# Altium footprint library ST封装.PcbLib: 1336 footprints (part 89 of 109) (continued)
## SQFP40X40-304(T) [mm] (continued)
Top Overlay:
  lines w0.2: -20.85,-40.15 -20.85,-41.8 -19.2,-41.8 ; -20.85,-1.25 -20.85,-0.4 -20.05,0.4 -19.2,0.4 ; 19.7,-41.8 21.35,-41.8 21.35,-40.15 ; 19.7,0.4 21.35,0.4 21.35,-1.25

## SQFP40X40-312(N) [mm]
pads (312):
  rect 1.6x0.4 smd: 1(0,0)
  oval 1.6x0.4 smd: 2(0,-0.5) 3(0,-1) 4(0,-1.5) 5(0,-2) 6(0,-2.5) 7(0,-3) 8(0,-3.5) 9(0,-4) 10(0,-4.5) 11(0,-5) 12(0,-5.5) 13(0,-6) 14(0,-6.5) 15(0,-7) 16(0,-7.5) 17(0,-8) 18(0,-8.5) 19(0,-9) 20(0,-9.5) 21(0,-10) 22(0,-10.5) 23(0,-11) 24(0,-11.5) 25(0,-12) 26(0,-12.5) 27(0,-13) 28(0,-13.5) 29(0,-14) 30(0,-14.5) 31(0,-15) 32(0,-15.5) 33(0,-16) 34(0,-16.5) 35(0,-17) 36(0,-17.5) 37(0,-18) 38(0,-18.5) 39(0,-19) 40(0,-19.5) 41(0,-20) 42(0,-20.5) 43(0,-21) 44(0,-21.5) 45(0,-22) 46(0,-22.5) 47(0,-23) 48(0,-23.5) 49(0,-24) 50(0,-24.5) 51(0,-25) 52(0,-25.5) 53(0,-26) 54(0,-26.5) 55(0,-27) 56(0,-27.5) 57(0,-28) 58(0,-28.5) 59(0,-29) 60(0,-29.5) 61(0,-30) 62(0,-30.5) 63(0,-31) 64(0,-31.5) 65(0,-32) 66(0,-32.5) 67(0,-33) 68(0,-33.5) 69(0,-34) 70(0,-34.5) 71(0,-35) 72(0,-35.5) 73(0,-36) 74(0,-36.5) 75(0,-37) 76(0,-37.5) 77(0,-38) 78(0,-38.5) 157(41.4,-38.5) 158(41.4,-38) 159(41.4,-37.5) 160(41.4,-37) 161(41.4,-36.5) 162(41.4,-36) 163(41.4,-35.5) 164(41.4,-35) 165(41.4,-34.5) 166(41.4,-34) 167(41.4,-33.5) 168(41.4,-33) 169(41.4,-32.5) 170(41.4,-32) 171(41.4,-31.5) 172(41.4,-31) 173(41.4,-30.5) 174(41.4,-30) 175(41.4,-29.5) 176(41.4,-29) 177(41.4,-28.5) 178(41.4,-28) 179(41.4,-27.5) 180(41.4,-27) 181(41.4,-26.5) 182(41.4,-26) 183(41.4,-25.5) 184(41.4,-25) 185(41.4,-24.5) 186(41.4,-24) 187(41.4,-23.5) 188(41.4,-23) 189(41.4,-22.5) 190(41.4,-22) 191(41.4,-21.5) 192(41.4,-21) 193(41.4,-20.5) 194(41.4,-20) 195(41.4,-19.5) 196(41.4,-19) 197(41.4,-18.5) 198(41.4,-18) 199(41.4,-17.5) 200(41.4,-17) 201(41.4,-16.5) 202(41.4,-16) 203(41.4,-15.5) 204(41.4,-15) 205(41.4,-14.5) 206(41.4,-14) 207(41.4,-13.5) 208(41.4,-13) 209(41.4,-12.5) 210(41.4,-12) 211(41.4,-11.5) 212(41.4,-11) 213(41.4,-10.5) 214(41.4,-10) 215(41.4,-9.5) 216(41.4,-9) 217(41.4,-8.5) 218(41.4,-8) 219(41.4,-7.5) 220(41.4,-7) 221(41.4,-6.5) 222(41.4,-6) 223(41.4,-5.5) 224(41.4,-5) 225(41.4,-4.5) 226(41.4,-4) 227(41.4,-3.5) 228(41.4,-3) 229(41.4,-2.5) 230(41.4,-2) 231(41.4,-1.5) 232(41.4,-1) 233(41.4,-0.5) 234(41.4,0)
  oval 0.4x1.6 smd: 79(1.45,-39.95) 80(1.95,-39.95) 81(2.45,-39.95) 82(2.95,-39.95) 83(3.45,-39.95) 84(3.95,-39.95) 85(4.45,-39.95) 86(4.95,-39.95) 87(5.45,-39.95) 88(5.95,-39.95) 89(6.45,-39.95) 90(6.95,-39.95) 91(7.45,-39.95) 92(7.95,-39.95) 93(8.45,-39.95) 94(8.95,-39.95) 95(9.45,-39.95) 96(9.95,-39.95) 97(10.45,-39.95) 98(10.95,-39.95) 99(11.45,-39.95) 100(11.95,-39.95) 101(12.45,-39.95) 102(12.95,-39.95) 103(13.45,-39.95) 104(13.95,-39.95) 105(14.45,-39.95) 106(14.95,-39.95) 107(15.45,-39.95) 108(15.95,-39.95) 109(16.45,-39.95) 110(16.95,-39.95) 111(17.45,-39.95) 112(17.95,-39.95) 113(18.45,-39.95) 114(18.95,-39.95) 115(19.45,-39.95) 116(19.95,-39.95) 117(20.45,-39.95) 118(20.95,-39.95) 119(21.45,-39.95) 120(21.95,-39.95) 121(22.45,-39.95) 122(22.95,-39.95) 123(23.45,-39.95) 124(23.95,-39.95) 125(24.45,-39.95) 126(24.95,-39.95) 127(25.45,-39.95) 128(25.95,-39.95) 129(26.45,-39.95) 130(26.95,-39.95) 131(27.45,-39.95) 132(27.95,-39.95) 133(28.45,-39.95) 134(28.95,-39.95) 135(29.45,-39.95) 136(29.95,-39.95) 137(30.45,-39.95) 138(30.95,-39.95) 139(31.45,-39.95) 140(31.95,-39.95) 141(32.45,-39.95) 142(32.95,-39.95) 143(33.45,-39.95) 144(33.95,-39.95) 145(34.45,-39.95) 146(34.95,-39.95) 147(35.45,-39.95) 148(35.95,-39.95) 149(36.45,-39.95) 150(36.95,-39.95) 151(37.45,-39.95) 152(37.95,-39.95) 153(38.45,-39.95) 154(38.95,-39.95) 155(39.45,-39.95) 156(39.95,-39.95) 235(39.95,1.45) 236(39.45,1.45) 237(38.95,1.45) 238(38.45,1.45) 239(37.95,1.45) 240(37.45,1.45) 241(36.95,1.45) 242(36.45,1.45) 243(35.95,1.45) 244(35.45,1.45) 245(34.95,1.45) 246(34.45,1.45) 247(33.95,1.45) 248(33.45,1.45) 249(32.95,1.45) 250(32.45,1.45) 251(31.95,1.45) 252(31.45,1.45) 253(30.95,1.45) 254(30.45,1.45) 255(29.95,1.45) 256(29.45,1.45) 257(28.95,1.45) 258(28.45,1.45) 259(27.95,1.45) 260(27.45,1.45) 261(26.95,1.45) 262(26.45,1.45) 263(25.95,1.45) 264(25.45,1.45) 265(24.95,1.45) 266(24.45,1.45) 267(23.95,1.45) 268(23.45,1.45) 269(22.95,1.45) 270(22.45,1.45) 271(21.95,1.45) 272(21.45,1.45) 273(20.95,1.45) 274(20.45,1.45) 275(19.95,1.45) 276(19.45,1.45) 277(18.95,1.45) 278(18.45,1.45) 279(17.95,1.45) 280(17.45,1.45) 281(16.95,1.45) 282(16.45,1.45) 283(15.95,1.45) 284(15.45,1.45) 285(14.95,1.45) 286(14.45,1.45) 287(13.95,1.45) 288(13.45,1.45) 289(12.95,1.45) 290(12.45,1.45) 291(11.95,1.45) 292(11.45,1.45) 293(10.95,1.45) 294(10.45,1.45) 295(9.95,1.45) 296(9.45,1.45) 297(8.95,1.45) 298(8.45,1.45) 299(7.95,1.45) 300(7.45,1.45) 301(6.95,1.45) 302(6.45,1.45) 303(5.95,1.45) 304(5.45,1.45) 305(4.95,1.45) 306(4.45,1.45) 307(3.95,1.45) 308(3.45,1.45) 309(2.95,1.45) 310(2.45,1.45) 311(1.95,1.45) 312(1.45,1.45)
Top Overlay:
  lines w0.2: -0.4,-39.2 -0.4,-40.35 0.75,-40.35 ; -0.4,0.7 -0.4,1.05 0.4,1.85 0.75,1.85 ; 40.65,-40.35 41.8,-40.35 41.8,-39.2 ; 40.65,1.85 41.8,1.85 41.8,0.7

## SQFP40X40-312(T) [mm]
pads (312):
  rect 0.4x1.6 smd: 1(0,0)
  oval 0.4x1.6 smd: 2(-0.5,0) 3(-1,0) 4(-1.5,0) 5(-2,0) 6(-2.5,0) 7(-3,0) 8(-3.5,0) 9(-4,0) 10(-4.5,0) 11(-5,0) 12(-5.5,0) 13(-6,0) 14(-6.5,0) 15(-7,0) 16(-7.5,0) 17(-8,0) 18(-8.5,0) 19(-9,0) 20(-9.5,0) 21(-10,0) 22(-10.5,0) 23(-11,0) 24(-11.5,0) 25(-12,0) 26(-12.5,0) 27(-13,0) 28(-13.5,0) 29(-14,0) 30(-14.5,0) 31(-15,0) 32(-15.5,0) 33(-16,0) 34(-16.5,0) 35(-17,0) 36(-17.5,0) 37(-18,0) 38(-18.5,0) 39(-19,0) 118(-19,-41.4) 119(-18.5,-41.4) 120(-18,-41.4) 121(-17.5,-41.4) 122(-17,-41.4) 123(-16.5,-41.4) 124(-16,-41.4) 125(-15.5,-41.4) 126(-15,-41.4) 127(-14.5,-41.4) 128(-14,-41.4) 129(-13.5,-41.4) 130(-13,-41.4) 131(-12.5,-41.4) 132(-12,-41.4) 133(-11.5,-41.4) 134(-11,-41.4) 135(-10.5,-41.4) 136(-10,-41.4) 137(-9.5,-41.4) 138(-9,-41.4) 139(-8.5,-41.4) 140(-8,-41.4) 141(-7.5,-41.4) 142(-7,-41.4) 143(-6.5,-41.4) 144(-6,-41.4) 145(-5.5,-41.4) 146(-5,-41.4) 147(-4.5,-41.4) 148(-4,-41.4) 149(-3.5,-41.4) 150(-3,-41.4) 151(-2.5,-41.4) 152(-2,-41.4) 153(-1.5,-41.4) 154(-1,-41.4) 155(-0.5,-41.4) 156(0,-41.4) 157(0.5,-41.4) 158(1,-41.4) 159(1.5,-41.4) 160(2,-41.4) 161(2.5,-41.4) 162(3,-41.4) 163(3.5,-41.4) 164(4,-41.4) 165(4.5,-41.4) 166(5,-41.4) 167(5.5,-41.4) 168(6,-41.4) 169(6.5,-41.4) 170(7,-41.4) 171(7.5,-41.4) 172(8,-41.4) 173(8.5,-41.4) 174(9,-41.4) 175(9.5,-41.4) 176(10,-41.4) 177(10.5,-41.4) 178(11,-41.4) 179(11.5,-41.4) 180(12,-41.4) 181(12.5,-41.4) 182(13,-41.4) 183(13.5,-41.4) 184(14,-41.4) 185(14.5,-41.4) 186(15,-41.4) 187(15.5,-41.4) 188(16,-41.4) 189(16.5,-41.4) 190(17,-41.4) 191(17.5,-41.4) 192(18,-41.4) 193(18.5,-41.4) 194(19,-41.4) 195(19.5,-41.4) 274(19.5,0) 275(19,0) 276(18.5,0) 277(18,0) 278(17.5,0) 279(17,0) 280(16.5,0) 281(16,0) 282(15.5,0) 283(15,0) 284(14.5,0) 285(14,0) 286(13.5,0) 287(13,0) 288(12.5,0) 289(12,0) 290(11.5,0) 291(11,0) 292(10.5,0) 293(10,0) 294(9.5,0) 295(9,0) 296(8.5,0) 297(8,0) 298(7.5,0) 299(7,0) 300(6.5,0) 301(6,0) 302(5.5,0) 303(5,0) 304(4.5,0) 305(4,0) 306(3.5,0) 307(3,0) 308(2.5,0) 309(2,0) 310(1.5,0) 311(1,0) 312(0.5,0)
  oval 1.6x0.4 smd: 40(-20.45,-1.45) 41(-20.45,-1.95) 42(-20.45,-2.45) 43(-20.45,-2.95) 44(-20.45,-3.45) 45(-20.45,-3.95) 46(-20.45,-4.45) 47(-20.45,-4.95) 48(-20.45,-5.45) 49(-20.45,-5.95) 50(-20.45,-6.45) 51(-20.45,-6.95) 52(-20.45,-7.45) 53(-20.45,-7.95) 54(-20.45,-8.45) 55(-20.45,-8.95) 56(-20.45,-9.45) 57(-20.45,-9.95) 58(-20.45,-10.45) 59(-20.45,-10.95) 60(-20.45,-11.45) 61(-20.45,-11.95) 62(-20.45,-12.45) 63(-20.45,-12.95) 64(-20.45,-13.45) 65(-20.45,-13.95) 66(-20.45,-14.45) 67(-20.45,-14.95) 68(-20.45,-15.45) 69(-20.45,-15.95) 70(-20.45,-16.45) 71(-20.45,-16.95) 72(-20.45,-17.45) 73(-20.45,-17.95) 74(-20.45,-18.45) 75(-20.45,-18.95) 76(-20.45,-19.45) 77(-20.45,-19.95) 78(-20.45,-20.45) 79(-20.45,-20.95) 80(-20.45,-21.45) 81(-20.45,-21.95) 82(-20.45,-22.45) 83(-20.45,-22.95) 84(-20.45,-23.45) 85(-20.45,-23.95) 86(-20.45,-24.45) 87(-20.45,-24.95) 88(-20.45,-25.45) 89(-20.45,-25.95) 90(-20.45,-26.45) 91(-20.45,-26.95) 92(-20.45,-27.45) 93(-20.45,-27.95) 94(-20.45,-28.45) 95(-20.45,-28.95) 96(-20.45,-29.45) 97(-20.45,-29.95) 98(-20.45,-30.45) 99(-20.45,-30.95) 100(-20.45,-31.45) 101(-20.45,-31.95) 102(-20.45,-32.45) 103(-20.45,-32.95) 104(-20.45,-33.45) 105(-20.45,-33.95) 106(-20.45,-34.45) 107(-20.45,-34.95) 108(-20.45,-35.45) 109(-20.45,-35.95) 110(-20.45,-36.45) 111(-20.45,-36.95) 112(-20.45,-37.45) 113(-20.45,-37.95) 114(-20.45,-38.45) 115(-20.45,-38.95) 116(-20.45,-39.45) 117(-20.45,-39.95) 196(20.95,-39.95) 197(20.95,-39.45) 198(20.95,-38.95) 199(20.95,-38.45) 200(20.95,-37.95) 201(20.95,-37.45) 202(20.95,-36.95) 203(20.95,-36.45) 204(20.95,-35.95) 205(20.95,-35.45) 206(20.95,-34.95) 207(20.95,-34.45) 208(20.95,-33.95) 209(20.95,-33.45) 210(20.95,-32.95) 211(20.95,-32.45) 212(20.95,-31.95) 213(20.95,-31.45) 214(20.95,-30.95) 215(20.95,-30.45) 216(20.95,-29.95) 217(20.95,-29.45) 218(20.95,-28.95) 219(20.95,-28.45) 220(20.95,-27.95) 221(20.95,-27.45) 222(20.95,-26.95) 223(20.95,-26.45) 224(20.95,-25.95) 225(20.95,-25.45) 226(20.95,-24.95) 227(20.95,-24.45) 228(20.95,-23.95) 229(20.95,-23.45) 230(20.95,-22.95) 231(20.95,-22.45) 232(20.95,-21.95) 233(20.95,-21.45) 234(20.95,-20.95) 235(20.95,-20.45) 236(20.95,-19.95) 237(20.95,-19.45) 238(20.95,-18.95) 239(20.95,-18.45) 240(20.95,-17.95) 241(20.95,-17.45) 242(20.95,-16.95) 243(20.95,-16.45) 244(20.95,-15.95) 245(20.95,-15.45) 246(20.95,-14.95) 247(20.95,-14.45) 248(20.95,-13.95) 249(20.95,-13.45) 250(20.95,-12.95) 251(20.95,-12.45) 252(20.95,-11.95) 253(20.95,-11.45) 254(20.95,-10.95) 255(20.95,-10.45) 256(20.95,-9.95) 257(20.95,-9.45) 258(20.95,-8.95) 259(20.95,-8.45) 260(20.95,-7.95) 261(20.95,-7.45) 262(20.95,-6.95) 263(20.95,-6.45) 264(20.95,-5.95) 265(20.95,-5.45) 266(20.95,-4.95) 267(20.95,-4.45) 268(20.95,-3.95) 269(20.95,-3.45) 270(20.95,-2.95) 271(20.95,-2.45) 272(20.95,-1.95) 273(20.95,-1.45)
Top Overlay:
  lines w0.2: -20.85,-40.65 -20.85,-41.8 -19.7,-41.8 ; -20.85,-0.75 -20.85,-0.4 -20.05,0.4 -19.7,0.4 ; 20.2,-41.8 21.35,-41.8 21.35,-40.65 ; 20.2,0.4 21.35,0.4 21.35,-0.75

## SQFP40X40-384(N) [mm]
pads (384):
  rect 1.6x0.3 smd: 1(0,0)
  oval 1.6x0.3 smd: 2(0,-0.4) 3(0,-0.8) 4(0,-1.2) 5(0,-1.6) 6(0,-2) 7(0,-2.4) 8(0,-2.8) 9(0,-3.2) 10(0,-3.6) 11(0,-4) 12(0,-4.4) 13(0,-4.8) 14(0,-5.2) 15(0,-5.6) 16(0,-6) 17(0,-6.4) 18(0,-6.8) 19(0,-7.2) 20(0,-7.6) 21(0,-8) 22(0,-8.4) 23(0,-8.8) 24(0,-9.2) 25(0,-9.6) 26(0,-10) 27(0,-10.4) 28(0,-10.8) 29(0,-11.2) 30(0,-11.6) 31(0,-12) 32(0,-12.4) 33(0,-12.8) 34(0,-13.2) 35(0,-13.6) 36(0,-14) 37(0,-14.4) 38(0,-14.8) 39(0,-15.2) 40(0,-15.6) 41(0,-16) 42(0,-16.4) 43(0,-16.8) 44(0,-17.2) 45(0,-17.6) 46(0,-18) 47(0,-18.4) 48(0,-18.8) 49(0,-19.2) 50(0,-19.6) 51(0,-20) 52(0,-20.4) 53(0,-20.8) 54(0,-21.2) 55(0,-21.6) 56(0,-22) 57(0,-22.4) 58(0,-22.8) 59(0,-23.2) 60(0,-23.6) 61(0,-24) 62(0,-24.4) 63(0,-24.8) 64(0,-25.2) 65(0,-25.6) 66(0,-26) 67(0,-26.4) 68(0,-26.8) 69(0,-27.2) 70(0,-27.6) 71(0,-28) 72(0,-28.4) 73(0,-28.8) 74(0,-29.2) 75(0,-29.6) 76(0,-30) 77(0,-30.4) 78(0,-30.8) 79(0,-31.2) 80(0,-31.6) 81(0,-32) 82(0,-32.4) 83(0,-32.8) 84(0,-33.2) 85(0,-33.6) 86(0,-34) 87(0,-34.4) 88(0,-34.8) 89(0,-35.2) 90(0,-35.6) 91(0,-36) 92(0,-36.4) 93(0,-36.8) 94(0,-37.2) 95(0,-37.6) 96(0,-38) 193(41.4,-38) 194(41.4,-37.6) 195(41.4,-37.2) 196(41.4,-36.8) 197(41.4,-36.4) 198(41.4,-36) 199(41.4,-35.6) 200(41.4,-35.2) 201(41.4,-34.8) 202(41.4,-34.4) 203(41.4,-34) 204(41.4,-33.6) 205(41.4,-33.2) 206(41.4,-32.8) 207(41.4,-32.4) 208(41.4,-32) 209(41.4,-31.6) 210(41.4,-31.2) 211(41.4,-30.8) 212(41.4,-30.4) 213(41.4,-30) 214(41.4,-29.6) 215(41.4,-29.2) 216(41.4,-28.8) 217(41.4,-28.4) 218(41.4,-28) 219(41.4,-27.6) 220(41.4,-27.2) 221(41.4,-26.8) 222(41.4,-26.4) 223(41.4,-26) 224(41.4,-25.6) 225(41.4,-25.2) 226(41.4,-24.8) 227(41.4,-24.4) 228(41.4,-24) 229(41.4,-23.6) 230(41.4,-23.2) 231(41.4,-22.8) 232(41.4,-22.4) 233(41.4,-22) 234(41.4,-21.6) 235(41.4,-21.2) 236(41.4,-20.8) 237(41.4,-20.4) 238(41.4,-20) 239(41.4,-19.6) 240(41.4,-19.2) 241(41.4,-18.8) 242(41.4,-18.4) 243(41.4,-18) 244(41.4,-17.6) 245(41.4,-17.2) 246(41.4,-16.8) 247(41.4,-16.4) 248(41.4,-16) 249(41.4,-15.6) 250(41.4,-15.2) 251(41.4,-14.8) 252(41.4,-14.4) 253(41.4,-14) 254(41.4,-13.6) 255(41.4,-13.2) 256(41.4,-12.8) 257(41.4,-12.4) 258(41.4,-12) 259(41.4,-11.6) 260(41.4,-11.2) 261(41.4,-10.8) 262(41.4,-10.4) 263(41.4,-10) 264(41.4,-9.6) 265(41.4,-9.2) 266(41.4,-8.8) 267(41.4,-8.4) 268(41.4,-8) 269(41.4,-7.6) 270(41.4,-7.2) 271(41.4,-6.8) 272(41.4,-6.4) 273(41.4,-6) 274(41.4,-5.6) 275(41.4,-5.2) 276(41.4,-4.8) 277(41.4,-4.4) 278(41.4,-4) 279(41.4,-3.6) 280(41.4,-3.2) 281(41.4,-2.8) 282(41.4,-2.4) 283(41.4,-2) 284(41.4,-1.6) 285(41.4,-1.2) 286(41.4,-0.8) 287(41.4,-0.4) 288(41.4,0)
  oval 0.3x1.6 smd: 97(1.7,-39.7) 98(2.1,-39.7) 99(2.5,-39.7) 100(2.9,-39.7) 101(3.3,-39.7) 102(3.7,-39.7) 103(4.1,-39.7) 104(4.5,-39.7) 105(4.9,-39.7) 106(5.3,-39.7) 107(5.7,-39.7) 108(6.1,-39.7) 109(6.5,-39.7) 110(6.9,-39.7) 111(7.3,-39.7) 112(7.7,-39.7) 113(8.1,-39.7) 114(8.5,-39.7) 115(8.9,-39.7) 116(9.3,-39.7) 117(9.7,-39.7) 118(10.1,-39.7) 119(10.5,-39.7) 120(10.9,-39.7) 121(11.3,-39.7) 122(11.7,-39.7) 123(12.1,-39.7) 124(12.5,-39.7) 125(12.9,-39.7) 126(13.3,-39.7) 127(13.7,-39.7) 128(14.1,-39.7) 129(14.5,-39.7) 130(14.9,-39.7) 131(15.3,-39.7) 132(15.7,-39.7) 133(16.1,-39.7) 134(16.5,-39.7) 135(16.9,-39.7) 136(17.3,-39.7) 137(17.7,-39.7) 138(18.1,-39.7) 139(18.5,-39.7) 140(18.9,-39.7) 141(19.3,-39.7) 142(19.7,-39.7) 143(20.1,-39.7) 144(20.5,-39.7) 145(20.9,-39.7) 146(21.3,-39.7) 147(21.7,-39.7) 148(22.1,-39.7) 149(22.5,-39.7) 150(22.9,-39.7) 151(23.3,-39.7) 152(23.7,-39.7) 153(24.1,-39.7) 154(24.5,-39.7) 155(24.9,-39.7) 156(25.3,-39.7) 157(25.7,-39.7) 158(26.1,-39.7) 159(26.5,-39.7) 160(26.9,-39.7) 161(27.3,-39.7) 162(27.7,-39.7) 163(28.1,-39.7) 164(28.5,-39.7) 165(28.9,-39.7) 166(29.3,-39.7) 167(29.7,-39.7) 168(30.1,-39.7) 169(30.5,-39.7) 170(30.9,-39.7) 171(31.3,-39.7) 172(31.7,-39.7) 173(32.1,-39.7) 174(32.5,-39.7) 175(32.9,-39.7) 176(33.3,-39.7) 177(33.7,-39.7) 178(34.1,-39.7) 179(34.5,-39.7) 180(34.9,-39.7) 181(35.3,-39.7) 182(35.7,-39.7) 183(36.1,-39.7) 184(36.5,-39.7) 185(36.9,-39.7) 186(37.3,-39.7) 187(37.7,-39.7) 188(38.1,-39.7) 189(38.5,-39.7) 190(38.9,-39.7) 191(39.3,-39.7) 192(39.7,-39.7) 289(39.7,1.7) 290(39.3,1.7) 291(38.9,1.7) 292(38.5,1.7) 293(38.1,1.7) 294(37.7,1.7) 295(37.3,1.7) 296(36.9,1.7) 297(36.5,1.7) 298(36.1,1.7) 299(35.7,1.7) 300(35.3,1.7) 301(34.9,1.7) 302(34.5,1.7) 303(34.1,1.7) 304(33.7,1.7) 305(33.3,1.7) 306(32.9,1.7) 307(32.5,1.7) 308(32.1,1.7) 309(31.7,1.7) 310(31.3,1.7) 311(30.9,1.7) 312(30.5,1.7) 313(30.1,1.7) 314(29.7,1.7) 315(29.3,1.7) 316(28.9,1.7) 317(28.5,1.7) 318(28.1,1.7) 319(27.7,1.7) 320(27.3,1.7) 321(26.9,1.7) 322(26.5,1.7) 323(26.1,1.7) 324(25.7,1.7) 325(25.3,1.7) 326(24.9,1.7) 327(24.5,1.7) 328(24.1,1.7) 329(23.7,1.7) 330(23.3,1.7) 331(22.9,1.7) 332(22.5,1.7) 333(22.1,1.7) 334(21.7,1.7) 335(21.3,1.7) 336(20.9,1.7) 337(20.5,1.7) 338(20.1,1.7) 339(19.7,1.7) 340(19.3,1.7) 341(18.9,1.7) 342(18.5,1.7) 343(18.1,1.7) 344(17.7,1.7) 345(17.3,1.7) 346(16.9,1.7) 347(16.5,1.7) 348(16.1,1.7) 349(15.7,1.7) 350(15.3,1.7) 351(14.9,1.7) 352(14.5,1.7) 353(14.1,1.7) 354(13.7,1.7) 355(13.3,1.7) 356(12.9,1.7) 357(12.5,1.7) 358(12.1,1.7) 359(11.7,1.7) 360(11.3,1.7) 361(10.9,1.7) 362(10.5,1.7) 363(10.1,1.7) 364(9.7,1.7) 365(9.3,1.7) 366(8.9,1.7) 367(8.5,1.7) 368(8.1,1.7) 369(7.7,1.7) 370(7.3,1.7) 371(6.9,1.7) 372(6.5,1.7) 373(6.1,1.7) 374(5.7,1.7) 375(5.3,1.7) 376(4.9,1.7) 377(4.5,1.7) 378(4.1,1.7) 379(3.7,1.7) 380(3.3,1.7) 381(2.9,1.7) 382(2.5,1.7) 383(2.1,1.7) 384(1.7,1.7)
Top Overlay:
  lines w0.2: -0.4,-38.65 -0.4,-40.1 1.05,-40.1 ; -0.4,0.65 -0.4,1.3 0.4,2.1 1.05,2.1 ; 40.35,-40.1 41.8,-40.1 41.8,-38.65 ; 40.35,2.1 41.8,2.1 41.8,0.65

## SQFP40X40-384(T) [mm]
pads (384):
  rect 0.3x1.6 smd: 1(0,0)
  oval 0.3x1.6 smd: 2(-0.4,0) 3(-0.8,0) 4(-1.2,0) 5(-1.6,0) 6(-2,0) 7(-2.4,0) 8(-2.8,0) 9(-3.2,0) 10(-3.6,0) 11(-4,0) 12(-4.4,0) 13(-4.8,0) 14(-5.2,0) 15(-5.6,0) 16(-6,0) 17(-6.4,0) 18(-6.8,0) 19(-7.2,0) 20(-7.6,0) 21(-8,0) 22(-8.4,0) 23(-8.8,0) 24(-9.2,0) 25(-9.6,0) 26(-10,0) 27(-10.4,0) 28(-10.8,0) 29(-11.2,0) 30(-11.6,0) 31(-12,0) 32(-12.4,0) 33(-12.8,0) 34(-13.2,0) 35(-13.6,0) 36(-14,0) 37(-14.4,0) 38(-14.8,0) 39(-15.2,0) 40(-15.6,0) 41(-16,0) 42(-16.4,0) 43(-16.8,0) 44(-17.2,0) 45(-17.6,0) 46(-18,0) 47(-18.4,0) 48(-18.8,0) 145(-18.8,-41.4) 146(-18.4,-41.4) 147(-18,-41.4) 148(-17.6,-41.4) 149(-17.2,-41.4) 150(-16.8,-41.4) 151(-16.4,-41.4) 152(-16,-41.4) 153(-15.6,-41.4) 154(-15.2,-41.4) 155(-14.8,-41.4) 156(-14.4,-41.4) 157(-14,-41.4) 158(-13.6,-41.4) 159(-13.2,-41.4) 160(-12.8,-41.4) 161(-12.4,-41.4) 162(-12,-41.4) 163(-11.6,-41.4) 164(-11.2,-41.4) 165(-10.8,-41.4) 166(-10.4,-41.4) 167(-10,-41.4) 168(-9.6,-41.4) 169(-9.2,-41.4) 170(-8.8,-41.4) 171(-8.4,-41.4) 172(-8,-41.4) 173(-7.6,-41.4) 174(-7.2,-41.4) 175(-6.8,-41.4) 176(-6.4,-41.4) 177(-6,-41.4) 178(-5.6,-41.4) 179(-5.2,-41.4) 180(-4.8,-41.4) 181(-4.4,-41.4) 182(-4,-41.4) 183(-3.6,-41.4) 184(-3.2,-41.4) 185(-2.8,-41.4) 186(-2.4,-41.4) 187(-2,-41.4) 188(-1.6,-41.4) 189(-1.2,-41.4) 190(-0.8,-41.4) 191(-0.4,-41.4) 192(0,-41.4) 193(0.4,-41.4) 194(0.8,-41.4) 195(1.2,-41.4) 196(1.6,-41.4) 197(2,-41.4) 198(2.4,-41.4) 199(2.8,-41.4) 200(3.2,-41.4) 201(3.6,-41.4) 202(4,-41.4) 203(4.4,-41.4) 204(4.8,-41.4) 205(5.2,-41.4) 206(5.6,-41.4) 207(6,-41.4) 208(6.4,-41.4) 209(6.8,-41.4) 210(7.2,-41.4) 211(7.6,-41.4) 212(8,-41.4) 213(8.4,-41.4) 214(8.8,-41.4) 215(9.2,-41.4) 216(9.6,-41.4) 217(10,-41.4) 218(10.4,-41.4) 219(10.8,-41.4) 220(11.2,-41.4) 221(11.6,-41.4) 222(12,-41.4) 223(12.4,-41.4) 224(12.8,-41.4) 225(13.2,-41.4) 226(13.6,-41.4) 227(14,-41.4) 228(14.4,-41.4) 229(14.8,-41.4) 230(15.2,-41.4) 231(15.6,-41.4) 232(16,-41.4) 233(16.4,-41.4) 234(16.8,-41.4) 235(17.2,-41.4) 236(17.6,-41.4) 237(18,-41.4) 238(18.4,-41.4) 239(18.8,-41.4) 240(19.2,-41.4) 337(19.2,0) 338(18.8,0) 339(18.4,0) 340(18,0) 341(17.6,0) 342(17.2,0) 343(16.8,0) 344(16.4,0) 345(16,0) 346(15.6,0) 347(15.2,0) 348(14.8,0) 349(14.4,0) 350(14,0) 351(13.6,0) 352(13.2,0) 353(12.8,0) 354(12.4,0) 355(12,0) 356(11.6,0) 357(11.2,0) 358(10.8,0) 359(10.4,0) 360(10,0) 361(9.6,0) 362(9.2,0) 363(8.8,0) 364(8.4,0) 365(8,0) 366(7.6,0) 367(7.2,0) 368(6.8,0) 369(6.4,0) 370(6,0) 371(5.6,0) 372(5.2,0) 373(4.8,0) 374(4.4,0) 375(4,0) 376(3.6,0) 377(3.2,0) 378(2.8,0) 379(2.4,0) 380(2,0) 381(1.6,0) 382(1.2,0) 383(0.8,0) 384(0.4,0)
  oval 1.6x0.3 smd: 49(-20.5,-1.7) 50(-20.5,-2.1) 51(-20.5,-2.5) 52(-20.5,-2.9) 53(-20.5,-3.3) 54(-20.5,-3.7) 55(-20.5,-4.1) 56(-20.5,-4.5) 57(-20.5,-4.9) 58(-20.5,-5.3) 59(-20.5,-5.7) 60(-20.5,-6.1) 61(-20.5,-6.5) 62(-20.5,-6.9) 63(-20.5,-7.3) 64(-20.5,-7.7) 65(-20.5,-8.1) 66(-20.5,-8.5) 67(-20.5,-8.9) 68(-20.5,-9.3) 69(-20.5,-9.7) 70(-20.5,-10.1) 71(-20.5,-10.5) 72(-20.5,-10.9) 73(-20.5,-11.3) 74(-20.5,-11.7) 75(-20.5,-12.1) 76(-20.5,-12.5) 77(-20.5,-12.9) 78(-20.5,-13.3) 79(-20.5,-13.7) 80(-20.5,-14.1) 81(-20.5,-14.5) 82(-20.5,-14.9) 83(-20.5,-15.3) 84(-20.5,-15.7) 85(-20.5,-16.1) 86(-20.5,-16.5) 87(-20.5,-16.9) 88(-20.5,-17.3) 89(-20.5,-17.7) 90(-20.5,-18.1) 91(-20.5,-18.5) 92(-20.5,-18.9) 93(-20.5,-19.3) 94(-20.5,-19.7) 95(-20.5,-20.1) 96(-20.5,-20.5) 97(-20.5,-20.9) 98(-20.5,-21.3) 99(-20.5,-21.7) 100(-20.5,-22.1) 101(-20.5,-22.5) 102(-20.5,-22.9) 103(-20.5,-23.3) 104(-20.5,-23.7) 105(-20.5,-24.1) 106(-20.5,-24.5) 107(-20.5,-24.9) 108(-20.5,-25.3) 109(-20.5,-25.7) 110(-20.5,-26.1) 111(-20.5,-26.5) 112(-20.5,-26.9) 113(-20.5,-27.3) 114(-20.5,-27.7) 115(-20.5,-28.1) 116(-20.5,-28.5) 117(-20.5,-28.9) 118(-20.5,-29.3) 119(-20.5,-29.7) 120(-20.5,-30.1) 121(-20.5,-30.5) 122(-20.5,-30.9) 123(-20.5,-31.3) 124(-20.5,-31.7) 125(-20.5,-32.1) 126(-20.5,-32.5) 127(-20.5,-32.9) 128(-20.5,-33.3) 129(-20.5,-33.7) 130(-20.5,-34.1) 131(-20.5,-34.5) 132(-20.5,-34.9) 133(-20.5,-35.3) 134(-20.5,-35.7) 135(-20.5,-36.1) 136(-20.5,-36.5) 137(-20.5,-36.9) 138(-20.5,-37.3) 139(-20.5,-37.7) 140(-20.5,-38.1) 141(-20.5,-38.5) 142(-20.5,-38.9) 143(-20.5,-39.3) 144(-20.5,-39.7) 241(20.9,-39.7) 242(20.9,-39.3) 243(20.9,-38.9) 244(20.9,-38.5) 245(20.9,-38.1) 246(20.9,-37.7) 247(20.9,-37.3) 248(20.9,-36.9) 249(20.9,-36.5) 250(20.9,-36.1) 251(20.9,-35.7) 252(20.9,-35.3) 253(20.9,-34.9) 254(20.9,-34.5) 255(20.9,-34.1) 256(20.9,-33.7) 257(20.9,-33.3) 258(20.9,-32.9) 259(20.9,-32.5) 260(20.9,-32.1) 261(20.9,-31.7) 262(20.9,-31.3) 263(20.9,-30.9) 264(20.9,-30.5) 265(20.9,-30.1) 266(20.9,-29.7) 267(20.9,-29.3) 268(20.9,-28.9) 269(20.9,-28.5) 270(20.9,-28.1) 271(20.9,-27.7) 272(20.9,-27.3) 273(20.9,-26.9) 274(20.9,-26.5) 275(20.9,-26.1) 276(20.9,-25.7) 277(20.9,-25.3) 278(20.9,-24.9) 279(20.9,-24.5) 280(20.9,-24.1) 281(20.9,-23.7) 282(20.9,-23.3) 283(20.9,-22.9) 284(20.9,-22.5) 285(20.9,-22.1) 286(20.9,-21.7) 287(20.9,-21.3) 288(20.9,-20.9) 289(20.9,-20.5) 290(20.9,-20.1) 291(20.9,-19.7) 292(20.9,-19.3) 293(20.9,-18.9) 294(20.9,-18.5) 295(20.9,-18.1) 296(20.9,-17.7) 297(20.9,-17.3) 298(20.9,-16.9) 299(20.9,-16.5) 300(20.9,-16.1) 301(20.9,-15.7) 302(20.9,-15.3) 303(20.9,-14.9) 304(20.9,-14.5) 305(20.9,-14.1) 306(20.9,-13.7) 307(20.9,-13.3) 308(20.9,-12.9) 309(20.9,-12.5) 310(20.9,-12.1) 311(20.9,-11.7) 312(20.9,-11.3) 313(20.9,-10.9) 314(20.9,-10.5) 315(20.9,-10.1) 316(20.9,-9.7) 317(20.9,-9.3) 318(20.9,-8.9) 319(20.9,-8.5) 320(20.9,-8.1) 321(20.9,-7.7) 322(20.9,-7.3) 323(20.9,-6.9) 324(20.9,-6.5) 325(20.9,-6.1) 326(20.9,-5.7) 327(20.9,-5.3) 328(20.9,-4.9) 329(20.9,-4.5) 330(20.9,-4.1) 331(20.9,-3.7) 332(20.9,-3.3) 333(20.9,-2.9) 334(20.9,-2.5) 335(20.9,-2.1) 336(20.9,-1.7)
Top Overlay:
  lines w0.2: -20.9,-40.35 -20.9,-41.8 -19.45,-41.8 ; -20.9,-1.05 -20.9,-0.4 -20.1,0.4 -19.45,0.4 ; 19.85,-41.8 21.3,-41.8 21.3,-40.35 ; 19.85,0.4 21.3,0.4 21.3,-1.05